# Altium footprint library hallglib.PcbLib: 106 footprints (part 1 of 7)
Each footprint in its own frame and in the unit in brackets; x right, y up, seen from the top. Pads: shape width x height; smd on the part's side, far side on the other; paste and mask are expansions set on the pad; w line width, h text height; cw(c..) or ccw(c..) is an arc to the next point about the centre after c.
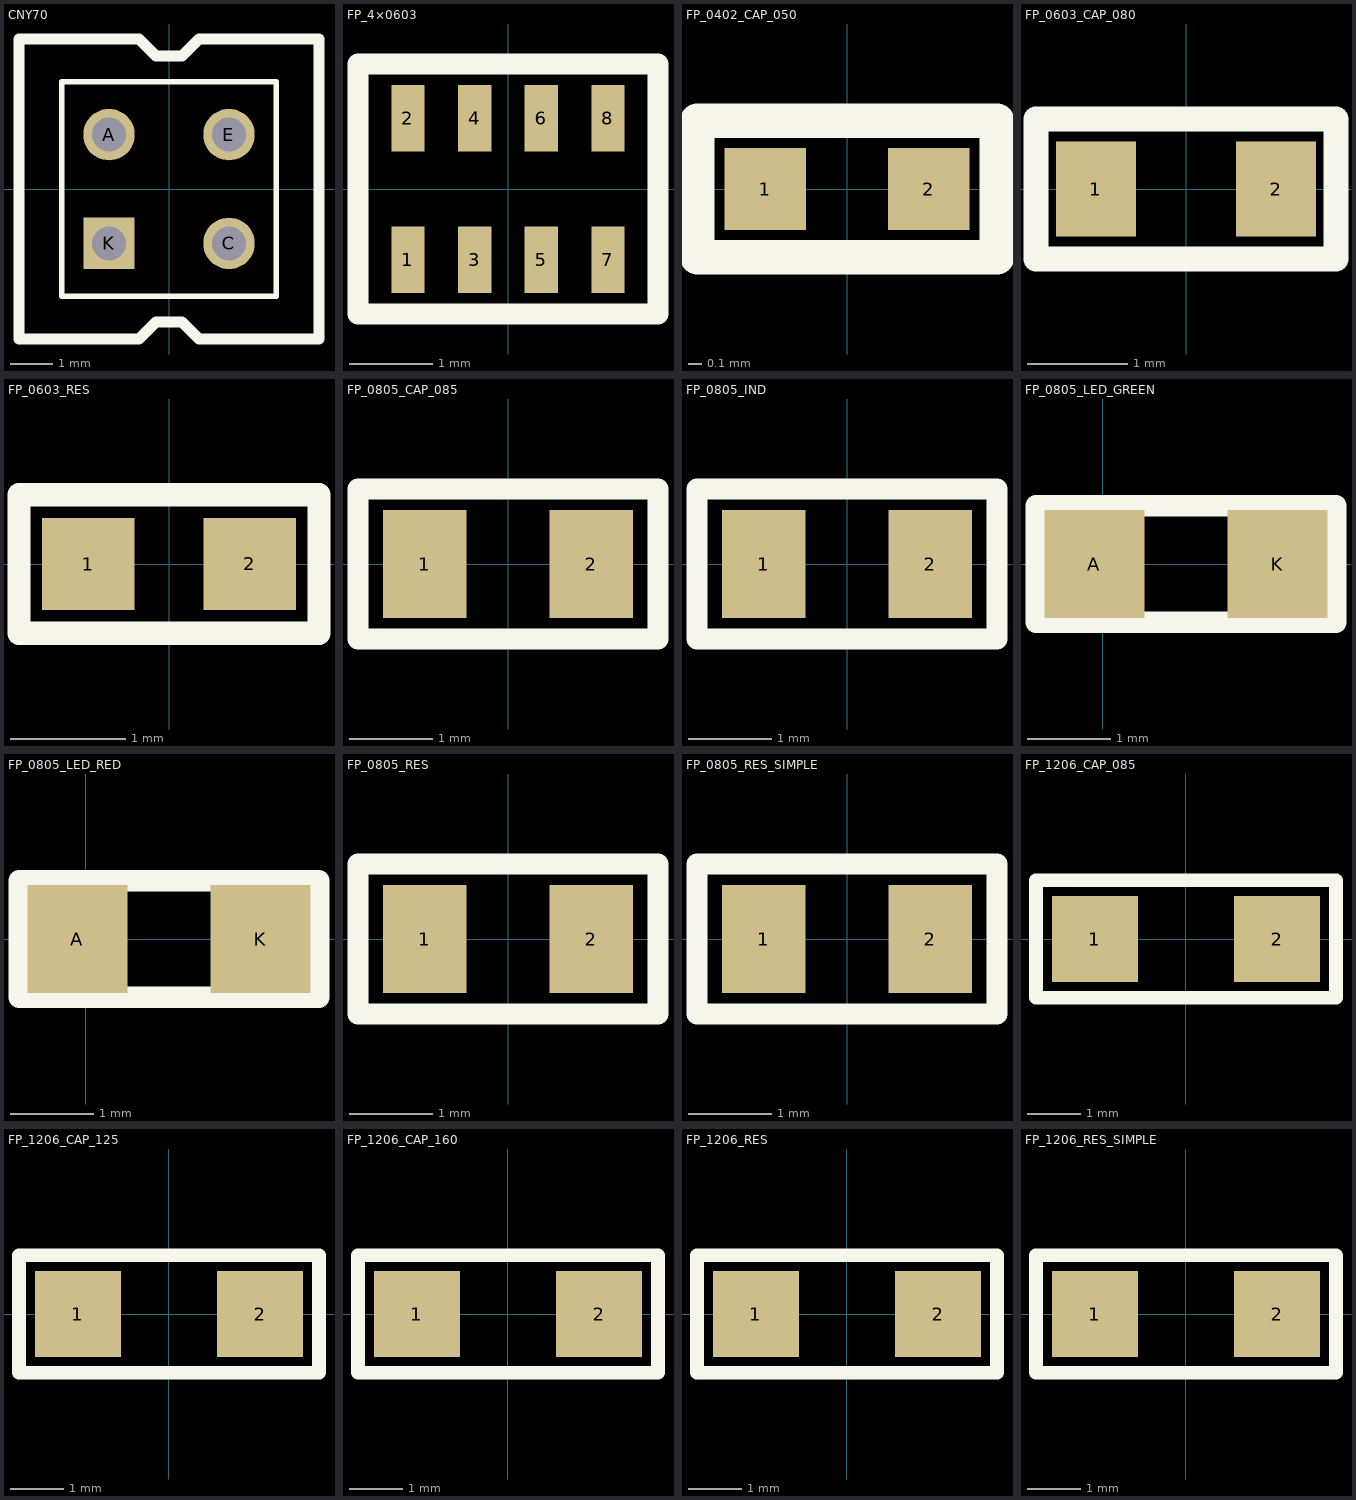
[diagram p0: the footprints below, top view; thin cyan lines are the x and y axes]

## CNY70 [mm]
height 6
pads (4):
  round 1.2 hole 0.8: A(-1.4,1.27) C(1.4,-1.27) E(1.4,1.27)
  rect 1.2x1.2 hole 0.8: K(-1.4,-1.27)
Top Overlay:
  lines w0.127: -2.5,-2.5 -2.5,2.5 2.5,2.5 2.5,-2.5 -2.5,-2.5
  lines w0.254: -3.5,-3.5 -0.7,-3.5 -0.3,-3.1 0.3,-3.1 0.7,-3.5 3.5,-3.5 3.5,3.5 0.7,3.5 0.3,3.1 -0.3,3.1 -0.7,3.5 -3.5,3.5 -3.5,-3.5
3D body "SW3dPS-cny70-1.STEP": height 6.02, standoff -5.73, extent -3.5,-3.5 3.5,3.5

## FP_4×0603 [mm] "4×0603-as ellenállásháló"
pads (8):
  rect 0.4x0.8 smd: 1(-1.2,-0.85) 2(-1.2,0.85) 3(-0.4,-0.85) 4(-0.4,0.85) 5(0.4,-0.85) 6(0.4,0.85) 7(1.2,-0.85) 8(1.2,0.85)
Top Overlay:
  lines w0.254: -1.8,-1.5 -1.8,1.5 1.8,1.5 1.8,-1.5 -1.8,-1.5
3D body "RN164P.STEP": height 0.55, standoff 0, extent -1.6,-0.8 1.6,0.8

## FP_0402_CAP_050 [mm] "0.5mm magas 0402 kapacitás"
height 0.55
pads (2):
  rect 0.6x0.6 smd: 1(-0.6,0) 2(0.6,0)
Top Overlay:
  lines w0.254: -1.1,-0.5 -1.1,0.5 1.1,0.5 1.1,-0.5 -1.1,-0.5
3D body: height 0.5, standoff 0, extent -0.3,-0.25 0.3,0.25
3D body: height 0.5, standoff 0, extent 0.3,-0.25 0.5,0.25
3D body: height 0.5, standoff 0, extent -0.5,-0.25 -0.3,0.25

## FP_0603_CAP_080 [mm] "0.8mm magas 0603 kapacitás"
height 0.9
pads (2):
  rect 0.8x0.95 smd: 1(-0.9,0) 2(0.9,0)
Top Overlay:
  lines w0.254: -1.5,-0.7 -1.5,0.7 1.5,0.7 1.5,-0.7 -1.5,-0.7
3D body: height 0.8, standoff 0, extent -0.5,-0.4 0.5,0.4
3D body: height 0.8, standoff 0, extent 0.5,-0.4 0.762,0.4
3D body: height 0.8, standoff 0, extent -0.8,-0.4 -0.5,0.4

## FP_0603_RES [mm] "0603 ellenállás"
height 0.55
pads (2):
  rect 0.8x0.8 smd: 1(-0.7,0) 2(0.7,0)
Top Overlay:
  lines w0.2: -1.3,-0.6 -1.3,0.6 1.3,0.6 1.3,-0.6 -1.3,-0.6
3D body "0603RES.STEP": height 0.44, standoff -0.01, extent -0.8,-0.4 0.8,0.4

## FP_0805_CAP_085 [mm] "0805 kapacitás YAGEO 0.85mm magas"
height 0.86
pads (2):
  rect 1x1.3 smd: 1(-1,0) 2(1,0)
Top Overlay:
  lines w0.254: -1.8,-0.9 1.8,-0.9 1.8,0.9 -1.8,0.9 -1.8,-0.9
3D body: height 0.85, standoff 0, extent -1,-0.635 -0.644,0.635
3D body: height 0.85, standoff 0, extent 0.676,-0.635 1.032,0.635
3D body: height 0.85, standoff 0, extent -0.644,-0.635 0.676,0.635

## FP_0805_IND [mm] "0805 power inductor"
height 1.45
pads (2):
  rect 1x1.3 smd: 1(-1,0) 2(1,0)
Top Overlay:
  lines w0.254: -1.8,-0.9 1.8,-0.9 1.8,0.9 -1.8,0.9 -1.8,-0.9
3D body: height 1.25, standoff 0, extent -1,-0.635 -0.644,0.635
3D body: height 1.25, standoff 0, extent 0.676,-0.635 1.032,0.635
3D body: height 1.25, standoff 0, extent -0.644,-0.635 0.676,0.635

## FP_0805_LED_GREEN [mm] "0805 méretû zöld LED"
height 1
pads (2):
  rect 1.2x1.3 smd: A(-0.1,0) K(2.1,0)
Top Overlay:
  lines w0.254: 2.3,-0.7 2.3,0.7 ; -0.8,-0.7 2.8,-0.7 2.8,0.7 -0.8,0.7 -0.8,-0.7
3D body "led_0805_green.step": height 1.1, standoff 0, extent 0.006,-0.625 2.026,0.625

## FP_0805_LED_RED [mm] "0805 méretû piros LED"
height 1
pads (2):
  rect 1.2x1.3 smd: A(-0.1,0) K(2.1,0)
Top Overlay:
  lines w0.254: 2.3,-0.7 2.3,0.7 ; -0.8,-0.7 -0.8,0.7 2.8,0.7 2.8,-0.7 -0.8,-0.7
3D body "led_0805r.STEP": height 1.1, standoff 0, extent 0.006,-0.625 2.026,0.625

## FP_0805_RES [mm] "0805 ellenállás"
height 0.5
pads (2):
  rect 1x1.3 smd: 1(-1,0) 2(1,0)
Top Overlay:
  lines w0.254: -1.8,-0.9 -1.8,0.9 1.8,0.9 1.8,-0.9 -1.8,-0.9
3D body "0805RES.STEP": height 0.62, standoff 0.02, extent -1,-0.625 1,0.625

## FP_0805_RES_SIMPLE [mm] "0805 ellenállás, amit én csináltam"
height 0.5
pads (2):
  rect 1x1.3 smd: 1(-1,0) 2(1,0)
Top Overlay:
  lines w0.254: -1.8,-0.9 -1.8,0.9 1.8,0.9 1.8,-0.9 -1.8,-0.9
3D body: height 0.5, standoff 0, extent -0.644,-0.635 0.676,0.635
3D body: height 0.5, standoff 0, extent 0.676,-0.635 1.032,0.635
3D body: height 0.5, standoff 0, extent -1,-0.635 -0.644,0.635

## FP_1206_CAP_085 [mm] "1206 kapacitás 0.85 mm"
height 0.86
pads (2):
  rect 1.6x1.6 smd: 1(-1.7,0) 2(1.7,0)
Top Overlay:
  lines w0.254: -2.8,-1.1 -2.8,1.1 2.8,1.1 2.8,-1.1 -2.8,-1.1
3D body: height 0.85, standoff 0, extent -1.522,-0.787 -1.065,0.787
3D body: height 0.85, standoff 0, extent 1.119,-0.787 1.577,0.787
3D body: height 0.85, standoff 0, extent -1.065,-0.787 1.119,0.787

## FP_1206_CAP_125 [mm] "1206 kapacitás 1.25 mm"
height 1.27
pads (2):
  rect 1.6x1.6 smd: 1(-1.7,0) 2(1.7,0)
Top Overlay:
  lines w0.254: -2.8,-1.1 2.8,-1.1 2.8,1.1 -2.8,1.1 -2.8,-1.1
3D body: height 1.25, standoff 0, extent -1.065,-0.787 1.119,0.787
3D body: height 1.25, standoff 0, extent 1.119,-0.787 1.577,0.787
3D body: height 1.25, standoff 0, extent -1.522,-0.787 -1.065,0.787

## FP_1206_CAP_160 [mm] "1206 kapacitás 1.6mm magas"
height 1.62
pads (2):
  rect 1.6x1.6 smd: 1(-1.7,0) 2(1.7,0)
Top Overlay:
  lines w0.254: -2.8,-1.1 -2.8,1.1 2.8,1.1 2.8,-1.1 -2.8,-1.1
3D body: height 1.6, standoff 0, extent -1.522,-0.787 -1.065,0.787
3D body: height 1.6, standoff 0, extent 1.119,-0.787 1.577,0.787
3D body: height 1.6, standoff 0, extent -1.065,-0.787 1.119,0.787

## FP_1206_RES [mm] "1206 ellenállás"
height 0.5
pads (2):
  rect 1.6x1.6 smd: 1(-1.7,0) 2(1.7,0)
Top Overlay:
  lines w0.254: -2.8,-1.1 2.8,-1.1 2.8,1.1 -2.8,1.1 -2.8,-1.1
3D body "1206RES.STEP": height 0.62, standoff 0.02, extent -1.6,-0.8 1.6,0.8

## FP_1206_RES_SIMPLE [mm] "1206 ellenállás, amit én csináltam"
height 0.5
pads (2):
  rect 1.6x1.6 smd: 1(-1.7,0) 2(1.7,0)
Top Overlay:
  lines w0.254: -2.8,-1.1 2.8,-1.1 2.8,1.1 -2.8,1.1 -2.8,-1.1
3D body: height 0.5, standoff 0, extent -1.065,-0.787 1.119,0.787
3D body: height 0.5, standoff 0, extent 1.119,-0.787 1.577,0.787
3D body: height 0.5, standoff 0, extent -1.522,-0.787 -1.065,0.787